# Altium footprint library LQFP.PcbLib: 36 footprints (part 1 of 3)
Each footprint in its own frame and in the unit in brackets; x right, y up, seen from the top. Pads: shape width x height; smd on the part's side, far side on the other; paste and mask are expansions set on the pad; w line width, h text height; cw(c..) or ccw(c..) is an arc to the next point about the centre after c.
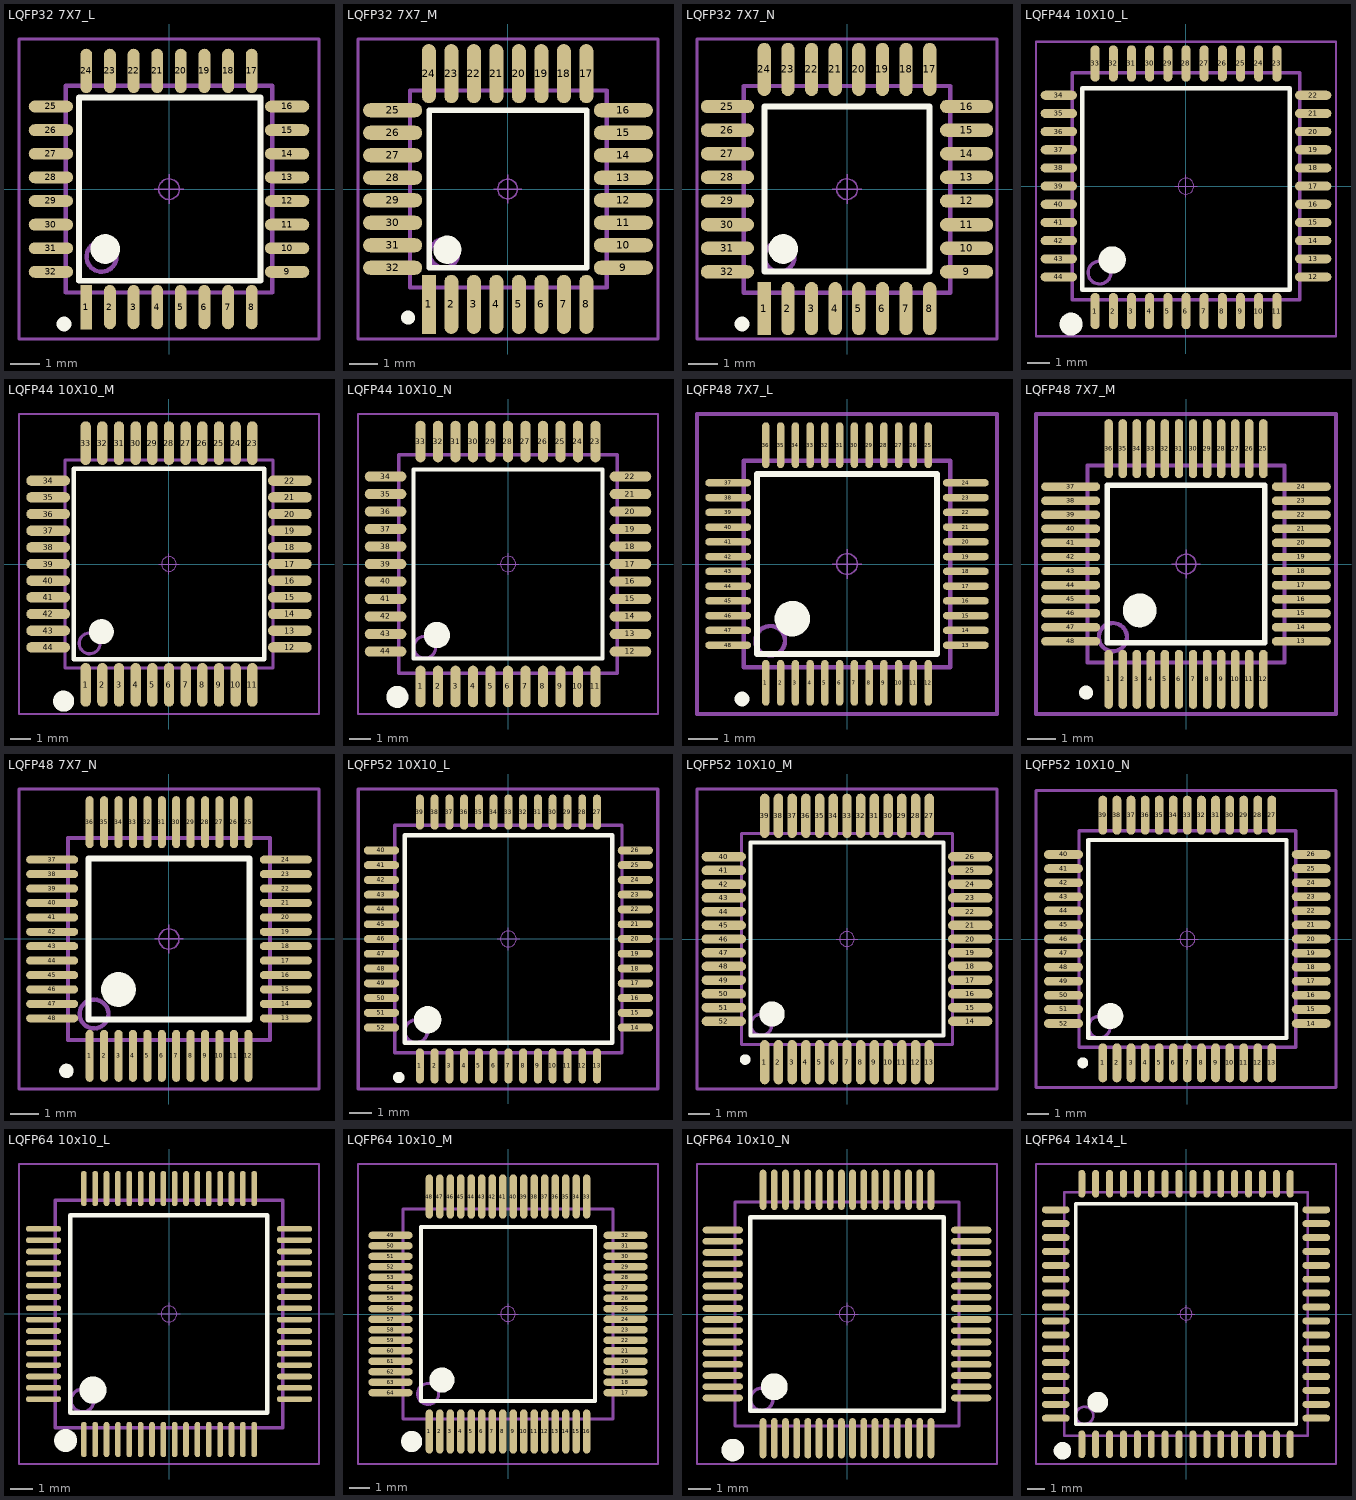
[diagram p0: the footprints below, top view; thin cyan lines are the x and y axes]

## LQFP32 7X7_L [mm] "32脚，体宽7x7mm，脚距0.8mm"
pads (32):
  rect 0.4x1.5 smd: 1(-2.8,-3.994)
  oval 0.4x1.5 smd: 2(-2,-3.994) 3(-1.2,-3.994) 4(-0.4,-3.994) 5(0.4,-3.994) 6(1.2,-3.994) 7(2,-3.994) 8(2.8,-3.994) 17(2.8,4.006) 18(2,4.006) 19(1.2,4.006) 20(0.4,4.006) 21(-0.4,4.006) 22(-1.2,4.006) 23(-2,4.006) 24(-2.8,4.006)
  oval 1.5x0.4 smd: 9(4,-2.8) 10(4,-2) 11(4,-1.2) 12(4,-0.4) 13(4,0.4) 14(4,1.2) 15(4,2) 16(4,2.8) 25(-4,2.8) 26(-4,2) 27(-4,1.2) 28(-4,0.4) 29(-4,-0.4) 30(-4,-1.2) 31(-4,-2) 32(-4,-2.8)
Top Overlay:
  circle w0.25: c-3.556,-4.566 r0.125
  circle w0.5: c-2.159,-2.026 r0.25
  lines w0.2: -3.048,-3.1 -3.048,3.1 3.1,3.1 3.1,-3.1 -3.048,-3.1
Mechanical 13:
  circle w0.15: c-2.286,-2.286 r0.508
  lines w0.15: -3.5,-3.5 -3.5,3.5 3.5,3.5 3.5,-3.5 -3.5,-3.5
Mechanical 15:
  circle w0.05: c0,0 r0.35
  lines w0.05: -0.5,0 0.5,0 ; 0,-0.5 0,0.5
  lines w0.1: -5.08,-5.074 -5.08,5.086 5.08,5.086 5.08,-5.074 -5.08,-5.074
3D body: height 1.45, standoff 0, extent -4.5,-4.5 4.5,4.5

## LQFP32 7X7_M [mm] "32脚，体宽7x7mm，脚距0.8mm"
pads (32):
  rect 0.5x2.1 smd: 1(-2.8,-4.1)
  oval 0.5x2.1 smd: 2(-2,-4.1) 3(-1.2,-4.1) 4(-0.4,-4.1) 5(0.4,-4.1) 6(1.2,-4.1) 7(2,-4.1) 8(2.8,-4.1) 17(2.8,4.1) 18(2,4.1) 19(1.2,4.1) 20(0.4,4.1) 21(-0.4,4.1) 22(-1.2,4.1) 23(-2,4.1) 24(-2.8,4.1)
  oval 2.1x0.5 smd: 9(4.114,-2.8) 10(4.114,-2) 11(4.114,-1.2) 12(4.114,-0.4) 13(4.114,0.4) 14(4.114,1.2) 15(4.114,2) 16(4.114,2.8) 25(-4.086,2.8) 26(-4.086,2) 27(-4.086,1.2) 28(-4.086,0.4) 29(-4.086,-0.4) 30(-4.086,-1.2) 31(-4.086,-2) 32(-4.086,-2.8)
Top Overlay:
  circle w0.25: c-3.542,-4.572 r0.125
  circle w0.5: c-2.145,-2.159 r0.25
  lines w0.2: -2.78,-2.794 -2.78,2.794 2.808,2.794 2.808,-2.794 -2.78,-2.794
Mechanical 13:
  circle w0.15: c-2.26,-2.286 r0.508
  lines w0.15: -3.474,-3.5 -3.474,3.5 3.526,3.5 3.526,-3.5 -3.474,-3.5
Mechanical 15:
  circle w0.05: c0,0 r0.35
  lines w0.05: -0.5,0 0.5,0 ; 0,-0.5 0,0.5
  lines w0.1: -5.32,-5.334 -5.32,5.334 5.348,5.334 5.348,-5.334 -5.32,-5.334
3D body: height 1.45, standoff 0, extent -4.5,-4.5 4.5,4.5

## LQFP32 7X7_N [mm] "32脚，体宽7x7mm，脚距0.8mm"
pads (32):
  rect 0.45x1.8 smd: 1(-2.8,-4.044)
  oval 0.45x1.8 smd: 2(-2,-4.044) 3(-1.2,-4.044) 4(-0.4,-4.044) 5(0.4,-4.044) 6(1.2,-4.044) 7(2,-4.044) 8(2.8,-4.044) 17(2.8,4.056) 18(2,4.056) 19(1.2,4.056) 20(0.4,4.056) 21(-0.4,4.056) 22(-1.2,4.056) 23(-2,4.056) 24(-2.8,4.056)
  oval 1.8x0.45 smd: 9(4.05,-2.8) 10(4.05,-2) 11(4.05,-1.2) 12(4.05,-0.4) 13(4.05,0.4) 14(4.05,1.2) 15(4.05,2) 16(4.05,2.8) 25(-4.05,2.8) 26(-4.05,2) 27(-4.05,1.2) 28(-4.05,0.4) 29(-4.05,-0.4) 30(-4.05,-1.2) 31(-4.05,-2) 32(-4.05,-2.8)
Top Overlay:
  circle w0.5: c-2.159,-2.026 r0.25
  circle w0.25: c-3.556,-4.566 r0.125
  lines w0.2: -2.794,-2.788 2.794,-2.788 2.794,2.8 -2.794,2.8 -2.794,-2.788
Mechanical 13:
  circle w0.15: c-2.286,-2.292 r0.508
  lines w0.15: -3.5,-3.506 3.5,-3.506 3.5,3.494 -3.5,3.494 -3.5,-3.506
Mechanical 15:
  circle w0.05: c0,0 r0.35
  lines w0.05: -0.5,0 0.5,0 ; 0,-0.5 0,0.5
  lines w0.1: -5.08,-5.074 5.08,-5.074 5.08,5.086 -5.08,5.086 -5.08,-5.074
3D body: height 1.45, standoff 0, extent -4.5,-4.5 4.5,4.5

## LQFP44 10X10_L [mm] "44脚，体宽10x10mm，脚距0.8mm"
pads (44):
  oval 0.4x1.6 smd: 1(-4,-5.5) 2(-3.2,-5.5) 3(-2.4,-5.5) 4(-1.6,-5.5) 5(-0.8,-5.5) 6(0,-5.5) 7(0.8,-5.5) 8(1.6,-5.5) 9(2.4,-5.5) 10(3.2,-5.5) 11(4,-5.5) 23(4,5.4) 24(3.2,5.4) 25(2.4,5.4) 26(1.6,5.4) 27(0.8,5.4) 28(0,5.4) 29(-0.8,5.4) 30(-1.6,5.4) 31(-2.4,5.4) 32(-3.2,5.4) 33(-4,5.4)
  oval 1.6x0.4 smd: 12(5.6,-4) 13(5.6,-3.2) 14(5.6,-2.4) 15(5.6,-1.6) 16(5.6,-0.8) 17(5.6,0) 18(5.6,0.8) 19(5.6,1.6) 20(5.6,2.4) 21(5.6,3.2) 22(5.6,4) 34(-5.6,4) 35(-5.6,3.2) 36(-5.6,2.4) 37(-5.6,1.6) 38(-5.6,0.8) 39(-5.6,0) 40(-5.6,-0.8) 41(-5.6,-1.6) 42(-5.6,-2.4) 43(-5.6,-3.2) 44(-5.6,-4)
Top Overlay:
  circle w0.508: c-5.06,-6.076 r0.25
  circle w0.6: c-3.25,-3.25 r0.3
  lines w0.2: -4.572,-4.572 4.572,-4.572 4.572,4.318 -4.572,4.318 -4.572,-4.572
Mechanical 13:
  circle w0.15: c-3.81,-3.81 r0.5
  lines w0.15: -5,-5 -5,5 5,5 5,-5 -5,-5
Mechanical 15:
  circle w0.05: c0,0 r0.35
  lines w0.05: -0.5,0 0.5,0 ; 0,-0.5 0,0.5
  lines w0.1: -6.604,-6.604 6.604,-6.604 6.604,6.35 -6.604,6.35 -6.604,-6.604
3D body: height 1.45, standoff 0, extent -6,-6 6,6

## LQFP44 10X10_M [mm] "44脚，体宽10x10mm，脚距0.8mm"
pads (44):
  oval 0.5x2.1 smd: 1(-4,-5.8) 2(-3.2,-5.8) 3(-2.4,-5.8) 4(-1.6,-5.8) 5(-0.8,-5.8) 6(0,-5.8) 7(0.8,-5.8) 8(1.6,-5.8) 9(2.4,-5.8) 10(3.2,-5.8) 11(4,-5.8) 23(4,5.8) 24(3.2,5.8) 25(2.4,5.8) 26(1.6,5.8) 27(0.8,5.8) 28(0,5.8) 29(-0.8,5.8) 30(-1.6,5.8) 31(-2.4,5.8) 32(-3.2,5.8) 33(-4,5.8)
  oval 2.1x0.5 smd: 12(5.8,-4) 13(5.8,-3.2) 14(5.8,-2.4) 15(5.8,-1.6) 16(5.8,-0.8) 17(5.8,0) 18(5.8,0.8) 19(5.8,1.6) 20(5.8,2.4) 21(5.8,3.2) 22(5.8,4) 34(-5.8,4) 35(-5.8,3.2) 36(-5.8,2.4) 37(-5.8,1.6) 38(-5.8,0.8) 39(-5.8,0) 40(-5.8,-0.8) 41(-5.8,-1.6) 42(-5.8,-2.4) 43(-5.8,-3.2) 44(-5.8,-4)
Top Overlay:
  circle w0.6: c-3.25,-3.25 r0.3
  circle w0.508: c-5.06,-6.584 r0.25
  lines w0.2: -4.572,-4.572 -4.572,4.572 4.572,4.572 4.572,-4.572 -4.572,-4.572
Mechanical 13:
  circle w0.15: c-3.81,-3.81 r0.5
  lines w0.15: -5,-5 -5,5 5,5 5,-5 -5,-5
Mechanical 15:
  circle w0.05: c0,0 r0.35
  lines w0.05: -0.5,0 0.5,0 ; 0,-0.5 0,0.5
  lines w0.1: -7.2,-7.2 -7.2,7.2 7.2,7.2 7.2,-7.2 -7.2,-7.2
3D body: height 1.45, standoff 0, extent -6,-6 6,6

## LQFP44 10X10_N [mm] "44脚，体宽10x10mm，脚距0.8mm"
pads (44):
  oval 0.45x1.9 smd: 1(-4,-5.6) 2(-3.2,-5.6) 3(-2.4,-5.6) 4(-1.6,-5.6) 5(-0.8,-5.6) 6(0,-5.6) 7(0.8,-5.6) 8(1.6,-5.6) 9(2.4,-5.6) 10(3.2,-5.6) 11(4,-5.6) 23(4,5.6) 24(3.2,5.6) 25(2.4,5.6) 26(1.6,5.6) 27(0.8,5.6) 28(0,5.6) 29(-0.8,5.6) 30(-1.6,5.6) 31(-2.4,5.6) 32(-3.2,5.6) 33(-4,5.6)
  oval 1.9x0.45 smd: 12(5.6,-4) 13(5.6,-3.2) 14(5.6,-2.4) 15(5.6,-1.6) 16(5.6,-0.8) 17(5.6,0) 18(5.6,0.8) 19(5.6,1.6) 20(5.6,2.4) 21(5.6,3.2) 22(5.6,4) 34(-5.6,4) 35(-5.6,3.2) 36(-5.6,2.4) 37(-5.6,1.6) 38(-5.6,0.8) 39(-5.6,0) 40(-5.6,-0.8) 41(-5.6,-1.6) 42(-5.6,-2.4) 43(-5.6,-3.2) 44(-5.6,-4)
Top Overlay:
  circle w0.6: c-3.25,-3.25 r0.3
  circle w0.508: c-5.06,-6.076 r0.25
  lines w0.2: -4.318,-4.318 4.318,-4.318 4.318,4.318 -4.318,4.318 -4.318,-4.318
Mechanical 13:
  circle w0.15: c-3.81,-3.81 r0.5
  lines w0.15: -5,-5 5,-5 5,5 -5,5 -5,-5
Mechanical 15:
  circle w0.05: c0,0 r0.35
  lines w0.05: -0.5,0 0.5,0 ; 0,-0.5 0,0.5
  lines w0.1: -6.858,-6.858 6.858,-6.858 6.858,6.858 -6.858,6.858 -6.858,-6.858
3D body: height 1.45, standoff 0, extent -6,-6 6,6

## LQFP48 7X7_L [mm] "48脚，体宽7x7mm，脚距0.5mm"
height 1.6
pads (48):
  oval 0.25x1.55 smd: 1(-2.75,-4.025) 2(-2.25,-4.025) 3(-1.75,-4.025) 4(-1.25,-4.025) 5(-0.75,-4.025) 6(-0.25,-4.025) 7(0.25,-4.025) 8(0.75,-4.025) 9(1.25,-4.025) 10(1.75,-4.025) 11(2.25,-4.025) 12(2.75,-4.025) 25(2.75,4.025) 26(2.25,4.025) 27(1.75,4.025) 28(1.25,4.025) 29(0.75,4.025) 30(0.25,4.025) 31(-0.25,4.025) 32(-0.75,4.025) 33(-1.25,4.025) 34(-1.75,4.025) 35(-2.25,4.025) 36(-2.75,4.025)
  oval 1.55x0.25 smd: 13(4.025,-2.75) 14(4.025,-2.25) 15(4.025,-1.75) 16(4.025,-1.25) 17(4.025,-0.75) 18(4.025,-0.25) 19(4.025,0.25) 20(4.025,0.75) 21(4.025,1.25) 22(4.025,1.75) 23(4.025,2.25) 24(4.025,2.75) 37(-4.025,2.75) 38(-4.025,2.25) 39(-4.025,1.75) 40(-4.025,1.25) 41(-4.025,0.75) 42(-4.025,0.25) 43(-4.025,-0.25) 44(-4.025,-0.75) 45(-4.025,-1.25) 46(-4.025,-1.75) 47(-4.025,-2.25) 48(-4.025,-2.75)
Top Overlay:
  circle w0.25: c-3.556,-4.572 r0.125
  circle w0.6: c-1.85,-1.85 r0.3
  lines w0.2: -3.048,-3.048 3.048,-3.048 3.048,3.048 -3.048,3.048 -3.048,-3.048
Mechanical 13:
  circle w0.15: c-2.6,-2.6 r0.5
  lines w0.15: -3.5,-3.5 3.5,-3.5 3.5,3.5 -3.5,3.5 -3.5,-3.5
Mechanical 15:
  circle w0.05: c0,0 r0.35
  lines w0.05: -0.5,0 0.5,0 ; 0,-0.5 0,0.5
  lines w0.15: -5.08,-5.08 5.08,-5.08 5.08,5.08 -5.08,5.08 -5.08,-5.08
3D body: height 1.45, standoff 0, extent -4.5,-4.5 4.5,4.5

## LQFP48 7X7_M [mm] "48脚，体宽7x7mm，脚距0.5mm"
height 1.6
pads (48):
  oval 0.3x2.1 smd: 1(-2.75,-4.1) 2(-2.25,-4.1) 3(-1.75,-4.1) 4(-1.25,-4.1) 5(-0.75,-4.1) 6(-0.25,-4.1) 7(0.25,-4.1) 8(0.75,-4.1) 9(1.25,-4.1) 10(1.75,-4.1) 11(2.25,-4.1) 12(2.75,-4.1) 25(2.75,4.1) 26(2.25,4.1) 27(1.75,4.1) 28(1.25,4.1) 29(0.75,4.1) 30(0.25,4.1) 31(-0.25,4.1) 32(-0.75,4.1) 33(-1.25,4.1) 34(-1.75,4.1) 35(-2.25,4.1) 36(-2.75,4.1)
  oval 2.1x0.3 smd: 13(4.1,-2.75) 14(4.1,-2.25) 15(4.1,-1.75) 16(4.1,-1.25) 17(4.1,-0.75) 18(4.1,-0.25) 19(4.1,0.25) 20(4.1,0.75) 21(4.1,1.25) 22(4.1,1.75) 23(4.1,2.25) 24(4.1,2.75) 37(-4.1,2.75) 38(-4.1,2.25) 39(-4.1,1.75) 40(-4.1,1.25) 41(-4.1,0.75) 42(-4.1,0.25) 43(-4.1,-0.25) 44(-4.1,-0.75) 45(-4.1,-1.25) 46(-4.1,-1.75) 47(-4.1,-2.25) 48(-4.1,-2.75)
Top Overlay:
  circle w0.25: c-3.556,-4.572 r0.125
  circle w0.6: c-1.65,-1.65 r0.3
  lines w0.2: -2.794,-2.794 2.794,-2.794 2.794,2.794 -2.794,2.794 -2.794,-2.794
Mechanical 13:
  circle w0.15: c-2.6,-2.6 r0.5
  lines w0.15: -3.5,-3.5 3.5,-3.5 3.5,3.5 -3.5,3.5 -3.5,-3.5
Mechanical 15:
  circle w0.05: c0,0 r0.35
  lines w0.05: -0.5,0 0.5,0 ; 0,-0.5 0,0.5
  lines w0.15: -5.334,-5.334 5.334,-5.334 5.334,5.334 -5.334,5.334 -5.334,-5.334
3D body: height 1.45, standoff 0, extent -4.5,-4.5 4.5,4.5

## LQFP48 7X7_N [mm] "48脚，体宽7x7mm，脚距0.5mm"
height 1.6
pads (48):
  oval 0.279x1.8 smd: 1(-2.75,-4.05) 2(-2.25,-4.05) 3(-1.75,-4.05) 4(-1.25,-4.05) 5(-0.75,-4.05) 6(-0.25,-4.05) 7(0.25,-4.05) 8(0.75,-4.05) 9(1.25,-4.05) 10(1.75,-4.05) 11(2.25,-4.05) 12(2.75,-4.05) 25(2.75,4.05) 26(2.25,4.05) 27(1.75,4.05) 28(1.25,4.05) 29(0.75,4.05) 30(0.25,4.05) 31(-0.25,4.05) 32(-0.75,4.05) 33(-1.25,4.05) 34(-1.75,4.05) 35(-2.25,4.05) 36(-2.75,4.05)
  oval 1.8x0.279 smd: 13(4.05,-2.75) 14(4.05,-2.25) 15(4.05,-1.75) 16(4.05,-1.25) 17(4.05,-0.75) 18(4.05,-0.25) 19(4.05,0.25) 20(4.05,0.75) 21(4.05,1.25) 22(4.05,1.75) 23(4.05,2.25) 24(4.05,2.75) 37(-4.05,2.75) 38(-4.05,2.25) 39(-4.05,1.75) 40(-4.05,1.25) 41(-4.05,0.75) 42(-4.05,0.25) 43(-4.05,-0.25) 44(-4.05,-0.75) 45(-4.05,-1.25) 46(-4.05,-1.75) 47(-4.05,-2.25) 48(-4.05,-2.75)
Top Overlay:
  circle w0.25: c-3.556,-4.572 r0.125
  circle w0.6: c-1.75,-1.75 r0.3
  lines w0.2: -2.794,-2.794 2.794,-2.794 2.794,2.794 -2.794,2.794 -2.794,-2.794
Mechanical 13:
  circle w0.15: c-2.6,-2.6 r0.5
  lines w0.15: -3.5,-3.5 -3.5,3.5 3.5,3.5 3.5,-3.5 -3.5,-3.5
Mechanical 15:
  circle w0.05: c0,0 r0.35
  lines w0.05: -0.5,0 0.5,0 ; 0,-0.5 0,0.5
  lines w0.1: -5.2,-5.2 5.2,-5.2 5.2,5.2 -5.2,5.2 -5.2,-5.2
3D body: height 1.45, standoff 0, extent -4.5,-4.5 4.5,4.5

## LQFP52 10X10_L [mm] "52脚，体宽10x10mm，脚距0.65mm"
height 1.6
pads (52):
  oval 0.35x1.55 smd: 1(-3.9,-5.588) 2(-3.25,-5.588) 3(-2.6,-5.588) 4(-1.95,-5.588) 5(-1.3,-5.588) 6(-0.65,-5.588) 7(0,-5.588) 8(0.65,-5.588) 9(1.3,-5.588) 10(1.95,-5.588) 11(2.6,-5.588) 12(3.25,-5.588) 13(3.9,-5.588) 27(3.9,5.588) 28(3.25,5.588) 29(2.6,5.588) 30(1.95,5.588) 31(1.3,5.588) 32(0.65,5.588) 33(0,5.588) 34(-0.65,5.588) 35(-1.3,5.588) 36(-1.95,5.588) 37(-2.6,5.588) 38(-3.25,5.588) 39(-3.9,5.588)
  oval 1.55x0.35 smd: 14(5.588,-3.9) 15(5.588,-3.25) 16(5.588,-2.6) 17(5.588,-1.95) 18(5.588,-1.3) 19(5.588,-0.65) 20(5.588,0) 21(5.588,0.65) 22(5.588,1.3) 23(5.588,1.95) 24(5.588,2.6) 25(5.588,3.25) 26(5.588,3.9) 40(-5.588,3.9) 41(-5.588,3.25) 42(-5.588,2.6) 43(-5.588,1.95) 44(-5.588,1.3) 45(-5.588,0.65) 46(-5.588,0) 47(-5.588,-0.65) 48(-5.588,-1.3) 49(-5.588,-1.95) 50(-5.588,-2.6) 51(-5.588,-3.25) 52(-5.588,-3.9)
Top Overlay:
  circle w0.6: c-3.556,-3.556 r0.3
  circle w0.25: c-4.826,-6.096 r0.125
  lines w0.2: -4.572,-4.572 -4.572,4.572 4.572,4.572 4.572,-4.572 -4.572,-4.572
Mechanical 13:
  circle w0.15: c-4.064,-4.064 r0.5
  lines w0.15: -5,-5 -5,5 5,5 5,-5 -5,-5
Mechanical 15:
  circle w0.05: c0,0 r0.35
  lines w0.05: -0.5,0 0.5,0 ; 0,-0.5 0,0.5
  lines w0.15: -6.604,-6.604 -6.604,6.604 6.567,6.604 6.567,-6.604 -6.604,-6.604
3D body: height 1.45, standoff 0, extent -6,-6 6,6

## LQFP52 10X10_M [mm] "52脚，体宽10x10mm，脚距0.65mm"
height 1.6
pads (52):
  oval 0.45x2.1 smd: 1(-3.9,-5.842) 2(-3.25,-5.842) 3(-2.6,-5.842) 4(-1.95,-5.842) 5(-1.3,-5.842) 6(-0.65,-5.842) 7(0,-5.842) 8(0.65,-5.842) 9(1.3,-5.842) 10(1.95,-5.842) 11(2.6,-5.842) 12(3.25,-5.842) 13(3.9,-5.842) 27(3.9,5.842) 28(3.25,5.842) 29(2.6,5.842) 30(1.95,5.842) 31(1.3,5.842) 32(0.65,5.842) 33(0,5.842) 34(-0.65,5.842) 35(-1.3,5.842) 36(-1.95,5.842) 37(-2.6,5.842) 38(-3.25,5.842) 39(-3.9,5.842)
  oval 2.1x0.45 smd: 14(5.842,-3.9) 15(5.842,-3.25) 16(5.842,-2.6) 17(5.842,-1.95) 18(5.842,-1.3) 19(5.842,-0.65) 20(5.842,0) 21(5.842,0.65) 22(5.842,1.3) 23(5.842,1.95) 24(5.842,2.6) 25(5.842,3.25) 26(5.842,3.9) 40(-5.842,3.9) 41(-5.842,3.25) 42(-5.842,2.6) 43(-5.842,1.95) 44(-5.842,1.3) 45(-5.842,0.65) 46(-5.842,0) 47(-5.842,-0.65) 48(-5.842,-1.3) 49(-5.842,-1.95) 50(-5.842,-2.6) 51(-5.842,-3.25) 52(-5.842,-3.9)
Top Overlay:
  circle w0.25: c-4.826,-5.715 r0.125
  circle w0.6: c-3.556,-3.556 r0.3
  lines w0.2: -4.572,-4.572 4.572,-4.572 4.572,4.572 -4.572,4.572 -4.572,-4.572
Mechanical 13:
  circle w0.15: c-4.064,-4.064 r0.5
  lines w0.15: -5,-5 5,-5 5,5 -5,5 -5,-5
Mechanical 15:
  circle w0.05: c0,0 r0.35
  lines w0.05: -0.5,0 0.5,0 ; 0,-0.5 0,0.5
  lines w0.15: -7.112,-7.112 7.112,-7.112 7.112,7.112 -7.112,7.112 -7.112,-7.112
3D body: height 1.45, standoff 0, extent -6,-6 6,6

## LQFP52 10X10_N [mm] "52脚，体宽10x10mm，脚距0.65mm"
height 1.6
pads (52):
  oval 0.4x1.8 smd: 1(-3.9,-5.715) 2(-3.25,-5.715) 3(-2.6,-5.715) 4(-1.95,-5.715) 5(-1.3,-5.715) 6(-0.65,-5.715) 7(0,-5.715) 8(0.65,-5.715) 9(1.3,-5.715) 10(1.95,-5.715) 11(2.6,-5.715) 12(3.25,-5.715) 13(3.9,-5.715) 27(3.9,5.715) 28(3.25,5.715) 29(2.6,5.715) 30(1.95,5.715) 31(1.3,5.715) 32(0.65,5.715) 33(0,5.715) 34(-0.65,5.715) 35(-1.3,5.715) 36(-1.95,5.715) 37(-2.6,5.715) 38(-3.25,5.715) 39(-3.9,5.715)
  oval 1.8x0.4 smd: 14(5.715,-3.9) 15(5.715,-3.25) 16(5.715,-2.6) 17(5.715,-1.95) 18(5.715,-1.3) 19(5.715,-0.65) 20(5.715,0) 21(5.715,0.65) 22(5.715,1.3) 23(5.715,1.95) 24(5.715,2.6) 25(5.715,3.25) 26(5.715,3.9) 40(-5.715,3.9) 41(-5.715,3.25) 42(-5.715,2.6) 43(-5.715,1.95) 44(-5.715,1.3) 45(-5.715,0.65) 46(-5.715,0) 47(-5.715,-0.65) 48(-5.715,-1.3) 49(-5.715,-1.95) 50(-5.715,-2.6) 51(-5.715,-3.25) 52(-5.715,-3.9)
Top Overlay:
  circle w0.6: c-3.556,-3.556 r0.3
  circle w0.25: c-4.826,-5.715 r0.125
  lines w0.2: -4.572,-4.572 -4.572,4.572 4.572,4.572 4.572,-4.572 -4.572,-4.572
Mechanical 13:
  circle w0.15: c-4.064,-4.064 r0.5
  lines w0.15: -5,-5 -5,5 5,5 5,-5 -5,-5
Mechanical 15:
  circle w0.05: c0,0 r0.35
  lines w0.05: -0.5,0 0.5,0 ; 0,-0.5 0,0.5
  lines w0.15: -6.985,-6.858 -6.985,6.858 6.858,6.858 6.858,-6.858 -6.985,-6.858
3D body: height 1.45, standoff 0, extent -6,-6 6,6

## LQFP64 10x10_L [mm] "64脚，体宽10x10mm，脚距0.5mm"
height 1.6
pads (64):
  oval 0.25x1.55 smd: 1(-3.75,-5.525) 2(-3.25,-5.525) 3(-2.75,-5.525) 4(-2.25,-5.525) 5(-1.75,-5.525) 6(-1.25,-5.525) 7(-0.75,-5.525) 8(-0.25,-5.525) 9(0.25,-5.525) 10(0.75,-5.525) 11(1.25,-5.525) 12(1.75,-5.525) 13(2.25,-5.525) 14(2.75,-5.525) 15(3.25,-5.525) 16(3.75,-5.525) 33(3.75,5.525) 34(3.25,5.525) 35(2.75,5.525) 36(2.25,5.525) 37(1.75,5.525) 38(1.25,5.525) 39(0.75,5.525) 40(0.25,5.525) 41(-0.25,5.525) 42(-0.75,5.525) 43(-1.25,5.525) 44(-1.75,5.525) 45(-2.25,5.525) 46(-2.75,5.525) 47(-3.25,5.525) 48(-3.75,5.525)
  oval 1.55x0.25 smd: 17(5.525,-3.75) 18(5.525,-3.25) 19(5.525,-2.75) 20(5.525,-2.25) 21(5.525,-1.75) 22(5.525,-1.25) 23(5.525,-0.75) 24(5.525,-0.25) 25(5.525,0.25) 26(5.525,0.75) 27(5.525,1.25) 28(5.525,1.75) 29(5.525,2.25) 30(5.525,2.75) 31(5.525,3.25) 32(5.525,3.75) 49(-5.525,3.75) 50(-5.525,3.25) 51(-5.525,2.75) 52(-5.525,2.25) 53(-5.525,1.75) 54(-5.525,1.25) 55(-5.525,0.75) 56(-5.525,0.25) 57(-5.525,-0.25) 58(-5.525,-0.75) 59(-5.525,-1.25) 60(-5.525,-1.75) 61(-5.525,-2.25) 62(-5.525,-2.75) 63(-5.525,-3.25) 64(-5.525,-3.75)
Top Overlay:
  circle w0.508: c-4.552,-5.568 r0.25
  circle w0.6: c-3.35,-3.35 r0.3
  lines w0.2: -4.35,-4.35 4.318,-4.35 4.318,4.35 -4.35,4.35 -4.35,-4.35
Mechanical 13:
  circle w0.15: c-3.81,-3.81 r0.5
  lines w0.15: -5,-5 5,-5 5,5 -5,5 -5,-5
Mechanical 15:
  circle w0.05: c0,0 r0.35
  lines w0.05: -0.5,0 0.5,0 ; 0,-0.5 0,0.5
  lines w0.1: -6.604,-6.604 6.604,-6.604 6.604,6.604 -6.604,6.604 -6.604,-6.604
3D body: height 1.45, standoff 0, extent -6,-6 6,6

## LQFP64 10x10_M [mm] "64脚，体宽10x10mm，脚距0.5mm"
height 1.6
pads (64):
  oval 0.35x2.1 smd: 1(-3.75,-5.6) 2(-3.25,-5.6) 3(-2.75,-5.6) 4(-2.25,-5.6) 5(-1.75,-5.6) 6(-1.25,-5.6) 7(-0.75,-5.6) 8(-0.25,-5.6) 9(0.25,-5.6) 10(0.75,-5.6) 11(1.25,-5.6) 12(1.75,-5.6) 13(2.25,-5.6) 14(2.75,-5.6) 15(3.25,-5.6) 16(3.75,-5.6) 33(3.75,5.6) 34(3.25,5.6) 35(2.75,5.6) 36(2.25,5.6) 37(1.75,5.6) 38(1.25,5.6) 39(0.75,5.6) 40(0.25,5.6) 41(-0.25,5.6) 42(-0.75,5.6) 43(-1.25,5.6) 44(-1.75,5.6) 45(-2.25,5.6) 46(-2.75,5.6) 47(-3.25,5.6) 48(-3.75,5.6)
  oval 2.1x0.35 smd: 17(5.6,-3.75) 18(5.6,-3.25) 19(5.6,-2.75) 20(5.6,-2.25) 21(5.6,-1.75) 22(5.6,-1.25) 23(5.6,-0.75) 24(5.6,-0.25) 25(5.6,0.25) 26(5.6,0.75) 27(5.6,1.25) 28(5.6,1.75) 29(5.6,2.25) 30(5.6,2.75) 31(5.6,3.25) 32(5.6,3.75) 49(-5.6,3.75) 50(-5.6,3.25) 51(-5.6,2.75) 52(-5.6,2.25) 53(-5.6,1.75) 54(-5.6,1.25) 55(-5.6,0.75) 56(-5.6,0.25) 57(-5.6,-0.25) 58(-5.6,-0.75) 59(-5.6,-1.25) 60(-5.6,-1.75) 61(-5.6,-2.25) 62(-5.6,-2.75) 63(-5.6,-3.25) 64(-5.6,-3.75)
Top Overlay:
  circle w0.508: c-4.592,-6.076 r0.25
  circle w0.6: c-3.15,-3.15 r0.3
  lines w0.2: -4.15,-4.15 4.15,-4.15 4.15,4.15 -4.15,4.15 -4.15,-4.15
Mechanical 13:
  circle w0.15: c-3.81,-3.81 r0.5
  lines w0.15: -5,-5 -5,5 5,5 5,-5 -5,-5
Mechanical 15:
  circle w0.05: c0,0 r0.35
  lines w0.05: -0.5,0 0.5,0 ; 0,-0.5 0,0.5
  lines w0.1: -7.15,-7.15 7.15,-7.15 7.15,7.15 -7.15,7.15 -7.15,-7.15
3D body: height 1.45, standoff 0, extent -6,-6 6,6

## LQFP64 10x10_N [mm] "64脚，体宽10x10mm，脚距0.5mm"
height 1.6
pads (64):
  oval 0.3x1.8 smd: 1(-3.75,-5.55) 2(-3.25,-5.55) 3(-2.75,-5.55) 4(-2.25,-5.55) 5(-1.75,-5.55) 6(-1.25,-5.55) 7(-0.75,-5.55) 8(-0.25,-5.55) 9(0.25,-5.55) 10(0.75,-5.55) 11(1.25,-5.55) 12(1.75,-5.55) 13(2.25,-5.55) 14(2.75,-5.55) 15(3.25,-5.55) 16(3.75,-5.55) 33(3.75,5.55) 34(3.25,5.55) 35(2.75,5.55) 36(2.25,5.55) 37(1.75,5.55) 38(1.25,5.55) 39(0.75,5.55) 40(0.25,5.55) 41(-0.25,5.55) 42(-0.75,5.55) 43(-1.25,5.55) 44(-1.75,5.55) 45(-2.25,5.55) 46(-2.75,5.55) 47(-3.25,5.55) 48(-3.75,5.55)
  oval 1.8x0.3 smd: 17(5.55,-3.75) 18(5.55,-3.25) 19(5.55,-2.75) 20(5.55,-2.25) 21(5.55,-1.75) 22(5.55,-1.25) 23(5.55,-0.75) 24(5.55,-0.25) 25(5.55,0.25) 26(5.55,0.75) 27(5.55,1.25) 28(5.55,1.75) 29(5.55,2.25) 30(5.55,2.75) 31(5.55,3.25) 32(5.55,3.75) 49(-5.55,3.75) 50(-5.55,3.25) 51(-5.55,2.75) 52(-5.55,2.25) 53(-5.55,1.75) 54(-5.55,1.25) 55(-5.55,0.75) 56(-5.55,0.25) 57(-5.55,-0.25) 58(-5.55,-0.75) 59(-5.55,-1.25) 60(-5.55,-1.75) 61(-5.55,-2.25) 62(-5.55,-2.75) 63(-5.55,-3.25) 64(-5.55,-3.75)
Top Overlay:
  circle w0.6: c-3.25,-3.25 r0.3
  circle w0.508: c-5.1,-6.076 r0.25
  lines w0.2: -4.318,-4.318 4.318,-4.318 4.318,4.318 -4.318,4.318 -4.318,-4.318
Mechanical 13:
  circle w0.15: c-3.81,-3.81 r0.5
  lines w0.15: -5,-5 -5,5 5,5 5,-5 -5,-5
Mechanical 15:
  circle w0.05: c0,0 r0.35
  lines w0.05: -0.5,0 0.5,0 ; 0,-0.5 0,0.5
  lines w0.1: -6.7,-6.7 6.7,-6.7 6.7,6.7 -6.7,6.7 -6.7,-6.7
3D body: height 1.45, standoff 0, extent -6,-6 6,6

## LQFP64 14x14_L [mm] "64脚，体宽14x14mm，脚距0.8mm"
height 1.6
pads (64):
  oval 0.4x1.6 smd: 1(-6,-7.5) 2(-5.2,-7.5) 3(-4.4,-7.5) 4(-3.6,-7.5) 5(-2.8,-7.5) 6(-2,-7.5) 7(-1.2,-7.5) 8(-0.4,-7.5) 9(0.4,-7.5) 10(1.2,-7.5) 11(2,-7.5) 12(2.8,-7.5) 13(3.6,-7.5) 14(4.4,-7.5) 15(5.2,-7.5) 16(6,-7.5) 33(6,7.5) 34(5.2,7.5) 35(4.4,7.5) 36(3.6,7.5) 37(2.8,7.5) 38(2,7.5) 39(1.2,7.5) 40(0.4,7.5) 41(-0.4,7.5) 42(-1.2,7.5) 43(-2,7.5) 44(-2.8,7.5) 45(-3.6,7.5) 46(-4.4,7.5) 47(-5.2,7.5) 48(-6,7.5)
  oval 1.6x0.4 smd: 17(7.5,-6) 18(7.5,-5.2) 19(7.5,-4.4) 20(7.5,-3.6) 21(7.5,-2.8) 22(7.5,-2) 23(7.5,-1.2) 24(7.5,-0.4) 25(7.5,0.4) 26(7.5,1.2) 27(7.5,2) 28(7.5,2.8) 29(7.5,3.6) 30(7.5,4.4) 31(7.5,5.2) 32(7.5,6) 49(-7.5,6) 50(-7.5,5.2) 51(-7.5,4.4) 52(-7.5,3.6) 53(-7.5,2.8) 54(-7.5,2) 55(-7.5,1.2) 56(-7.5,0.4) 57(-7.5,-0.4) 58(-7.5,-1.2) 59(-7.5,-2) 60(-7.5,-2.8) 61(-7.5,-3.6) 62(-7.5,-4.4) 63(-7.5,-5.2) 64(-7.5,-6)
Top Overlay:
  circle w0.508: c-7.112,-7.874 r0.25
  circle w0.6: c-5.08,-5.08 r0.3
  lines w0.2: -6.35,-6.35 6.35,-6.35 6.35,6.35 -6.35,6.35 -6.35,-6.35
Mechanical 13:
  circle w0.15: c-5.842,-5.842 r0.5
  lines w0.15: -7,-7 7,-7 7,7 -7,7 -7,-7
Mechanical 15:
  circle w0.05: c0,0 r0.35
  lines w0.05: -0.5,0 0.5,0 ; 0,-0.5 0,0.5
  lines w0.1: -8.636,-8.636 8.636,-8.636 8.636,8.636 -8.636,8.636 -8.636,-8.636
3D body: height 1.45, standoff 0, extent -8,-8 8,8